# Altium footprint library TSC Footprints.PcbLib: 99 footprints (part 3 of 7)
Each footprint in its own frame and in the unit in brackets; x right, y up, seen from the top. Pads: shape width x height; smd on the part's side, far side on the other; paste and mask are expansions set on the pad; w line width, h text height; cw(c..) or ccw(c..) is an arc to the next point about the centre after c.
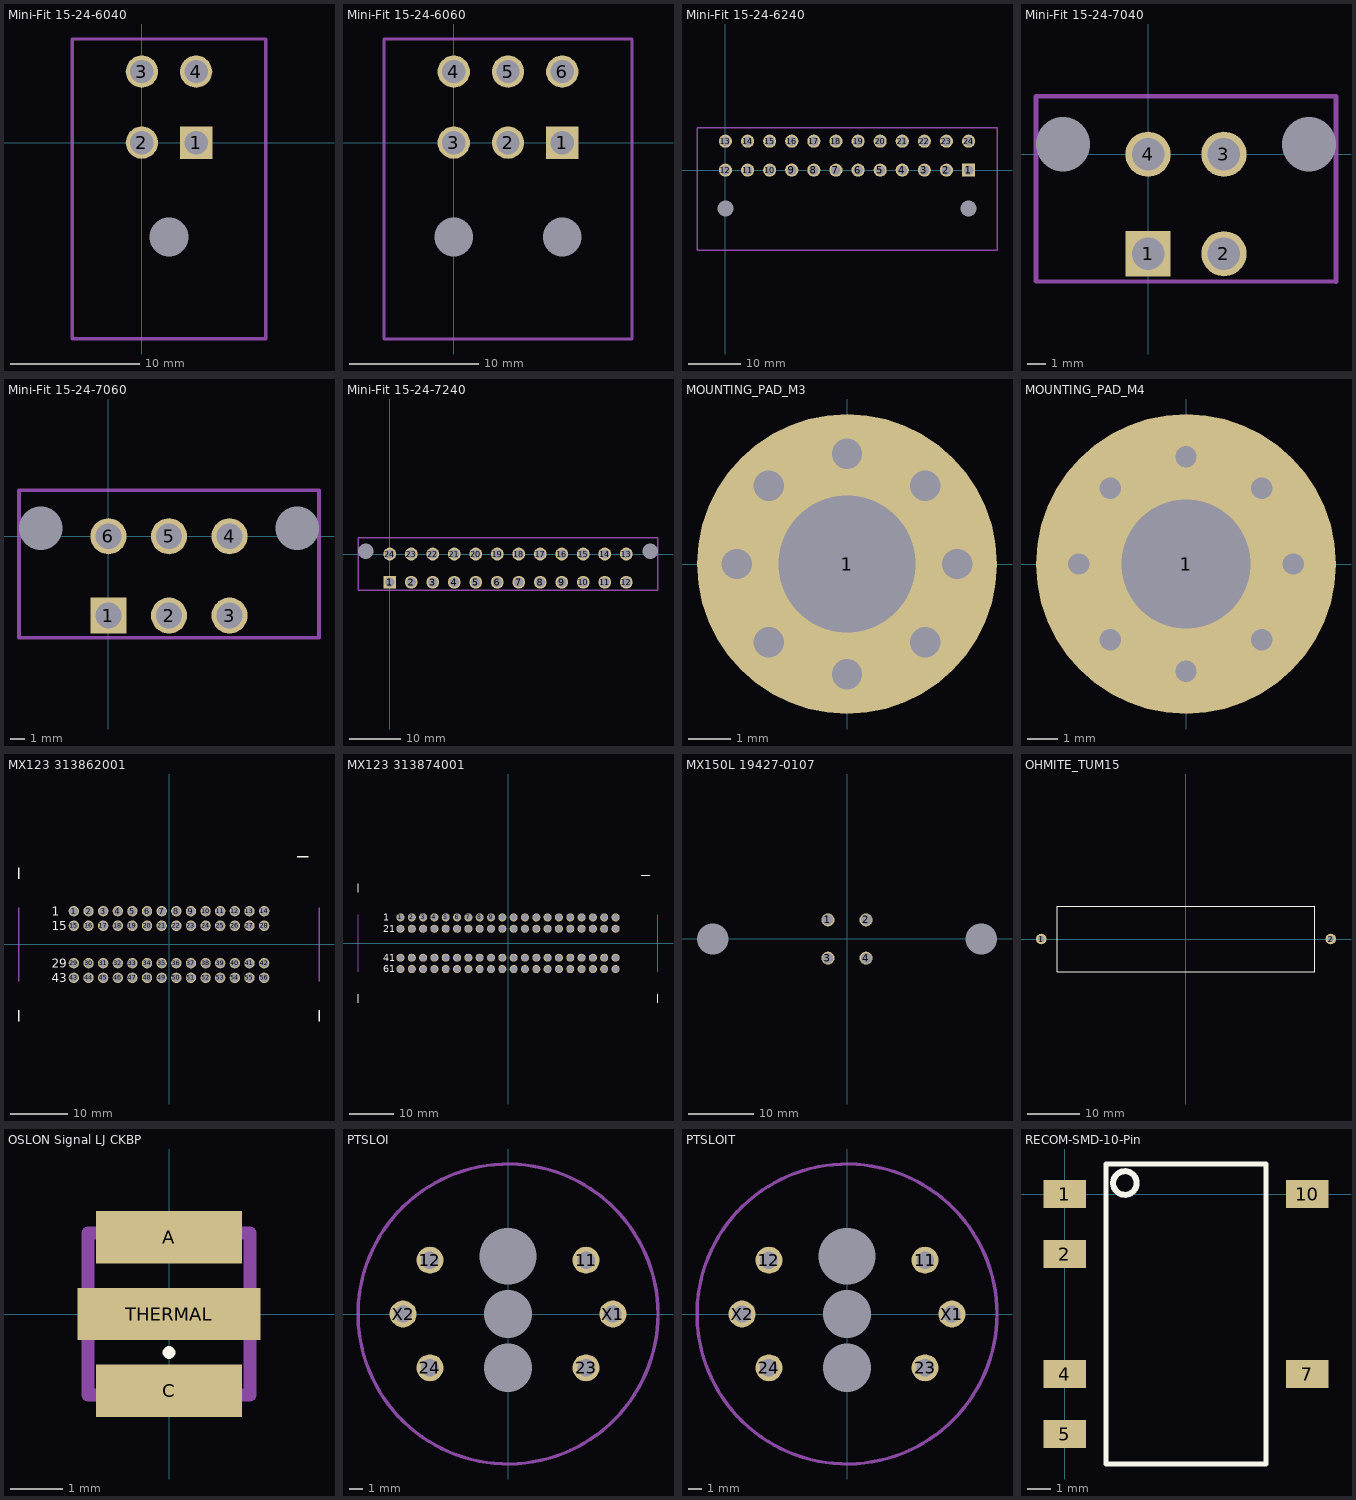
[diagram p2: the footprints below, top view; thin cyan lines are the x and y axes]

## Mini-Fit 15-24-6040 [mm] "Mini-Fit BMI Header 4 circuits"
height 15
pads (5):
  rect 2.5x2.5 hole 1.8: 1(4.2,0)
  round 2.5 hole 1.8: 2(0,0) 3(0,5.5) 4(4.2,5.5)
  round 0 hole 3 unplated: ""(2.1,-7.3)
Mechanical 1:
  lines w0.254: 9.586,-15.186 -5.4,-15.186 -5.4,8.025 9.6,8.025 9.6,-15.2
3D body "015246040.stp": height 15, standoff -3.3, extent -5.4,-15.2 9.6,6.025

## Mini-Fit 15-24-6060 [mm] "Mini-Fit BMI Header 6 circuits"
height 15
pads (8):
  rect 2.5x2.5 hole 1.8: 1(8.4,0)
  round 2.5 hole 1.8: 2(4.2,0) 3(0,0) 4(0,5.5) 5(4.2,5.5) 6(8.4,5.5)
  round 0 hole 3 unplated: ""(0,-7.3) ""(8.4,-7.3)
Mechanical 1:
  lines w0.254: -5.4,-15.2 -5.4,8.025 13.8,8.025 13.8,-15.2 -5.4,-15.2
3D body "015246060.stp": height 15, standoff -3.6, extent -5.4,-15.2 13.8,6.025

## Mini-Fit 15-24-6240 [mm] "Mini-Fit BMI Header 24 circuits"
height 15
pads (26):
  rect 2.5x2.5 hole 1.8: 1(46.2,0)
  round 2.5 hole 1.8: 2(42,0) 3(37.8,0) 4(33.6,0) 5(29.4,0) 6(25.2,0) 7(21,0) 8(16.8,0) 9(12.6,0) 10(8.4,0) 11(4.2,0) 12(0,0) 13(0,5.5) 14(4.2,5.5) 15(8.4,5.5) 16(12.6,5.5) 17(16.8,5.5) 18(21,5.5) 19(25.2,5.5) 20(29.4,5.5) 21(33.6,5.5) 22(37.8,5.5) 23(42,5.5) 24(46.2,5.5)
  round 0 hole 3 unplated: ""(0,-7.3) ""(46.2,-7.3)
Mechanical 1:
  lines w0.254: -5.4,-15.2 51.6,-15.2 51.6,8.025 -5.4,8.025 -5.4,-15.2
3D body "015246240.stp": height 15, standoff -3.6, extent -5.4,-15.2 51.6,6.025

## Mini-Fit 15-24-7040 [mm] "Mini-Fit BMI Receptacle Header 4 circuits"
height 11.3
pads (6):
  rect 2.5x2.5 hole 1.8: 1(0,-5.5)
  round 2.5 hole 1.8: 2(4.2,-5.5) 3(4.2,0) 4(0,0)
  round 0 hole 3 unplated: ""(-4.7,0.56) ""(8.9,0.56)
Mechanical 1:
  lines w0.254: -6.2,-7.03 -6.2,3.2 10.4,3.2 10.4,-7.044 -6.2,-7.03
3D body "015247040.stp": height 11.3, standoff -3.53, extent -5.566,-6.705 9.834,2.895

## Mini-Fit 15-24-7060 [mm] "Mini-Fit BMI Receptacle Header 6 circuits"
height 11.3
pads (8):
  rect 2.5x2.5 hole 1.8: 1(0,-5.5)
  round 2.5 hole 1.8: 2(4.2,-5.5) 3(8.4,-5.5) 4(8.4,0) 5(4.2,0) 6(0,0)
  round 0 hole 3 unplated: ""(-4.7,0.56) ""(13.1,0.56)
Mechanical 1:
  lines w0.254: 14.6,-7.048 -6.2,-7.03 -6.2,3.2 14.6,3.2 14.6,-7.044
3D body "015247060.stp": height 11.3, standoff -3.53, extent -5.566,-6.705 14.034,2.895

## Mini-Fit 15-24-7240 [mm] "Mini-Fit BMI Receptacle Header 24 circuits"
height 11.3
pads (26):
  rect 2.5x2.5 hole 1.8: 1(0,-5.5)
  round 2.5 hole 1.8: 2(4.2,-5.5) 3(8.4,-5.5) 4(12.6,-5.5) 5(16.8,-5.5) 6(21,-5.5) 7(25.2,-5.5) 8(29.4,-5.5) 9(33.6,-5.5) 10(37.8,-5.5) 11(42,-5.5) 12(46.2,-5.5) 13(46.2,0) 14(42,0) 15(37.8,0) 16(33.6,0) 17(29.4,0) 18(25.2,0) 19(21,0) 20(16.8,0) 21(12.6,0) 22(8.4,0) 23(4.2,0) 24(0,0)
  round 0 hole 3 unplated: ""(-4.7,0.56) ""(50.9,0.56)
Mechanical 1:
  lines w0.254: 52.4,-7.081 -6.2,-7.03 -6.2,3.2 52.4,3.2 52.4,-7.044
3D body "015247240.stp": height 11.3, standoff -3.53, extent -5.566,-6.705 51.834,2.895

## MOUNTING_PAD_M3 [mm] "M3 mounting pad"
pads (1):
  round 7 hole 3.2: 1(0,0)
via -1.821,1.821 diameter 1.27 hole 0.711
via 1.821,1.821 diameter 1.27 hole 0.711
via 1.821,-1.821 diameter 1.27 hole 0.711
via -1.821,-1.821 diameter 1.27 hole 0.711
via 2.575,0 diameter 1.27 hole 0.711
via -2.575,0 diameter 1.27 hole 0.711
via 0,-2.575 diameter 1.27 hole 0.711
via 0,2.575 diameter 1.27 hole 0.711

## MOUNTING_PAD_M4 [mm] "M4 mounting pad"
pads (1):
  round 10 hole 4.3: 1(0,0)
via -2.528,-2.528 diameter 1.27 hole 0.711
via 2.528,-2.528 diameter 1.27 hole 0.711
via 2.528,2.528 diameter 1.27 hole 0.711
via 0,3.575 diameter 1.27 hole 0.711
via 0,-3.575 diameter 1.27 hole 0.711
via -3.575,0 diameter 1.27 hole 0.711
via -2.528,2.528 diameter 1.27 hole 0.711
via 3.575,0 diameter 1.27 hole 0.711

## MX123 313862001 [mm] "56-Pin vertical sealed header"
height 31.55
pads (56):
  round 1.8 hole 1.47: 1(-16.51,5.79) 2(-13.97,5.79) 3(-11.43,5.79) 4(-8.89,5.79) 5(-6.35,5.79) 6(-3.81,5.79) 7(-1.27,5.79) 8(1.27,5.79) 9(3.81,5.79) 10(6.35,5.79) 11(8.89,5.79) 12(11.43,5.79) 13(13.97,5.79) 14(16.51,5.79) 15(-16.51,3.25) 16(-13.97,3.25) 17(-11.43,3.25) 18(-8.89,3.25) 19(-6.35,3.25) 20(-3.81,3.25) 21(-1.27,3.25) 22(1.27,3.25) 23(3.81,3.25) 24(6.35,3.25) 25(8.89,3.25) 26(11.43,3.25) 27(13.97,3.25) 28(16.51,3.25) 29(-16.51,-3.25) 30(-13.97,-3.25) 31(-11.43,-3.25) 32(-8.89,-3.25) 33(-6.35,-3.25) 34(-3.81,-3.25) 35(-1.27,-3.25) 36(1.27,-3.25) 37(3.81,-3.25) 38(6.35,-3.25) 39(8.89,-3.25) 40(11.43,-3.25) 41(13.97,-3.25) 42(16.51,-3.25) 43(-16.51,-5.79) 44(-13.97,-5.79) 45(-11.43,-5.79) 46(-8.89,-5.79) 47(-6.35,-5.79) 48(-3.81,-5.79) 49(-1.27,-5.79) 50(1.27,-5.79) 51(3.81,-5.79) 52(6.35,-5.79) 53(8.89,-5.79) 54(11.43,-5.79) 55(13.97,-5.79) 56(16.51,-5.79)
Top Overlay:
  lines w0.254: -26.035,-13.335 -26.035,-11.43 ; -26.035,11.43 -26.035,13.335 ; 22.225,15.24 24.13,15.24 ; 26.035,-13.335 26.035,-11.43
  text "43" at -20.32,-6.552 h1.52
  text "15" at -20.32,2.488 h1.52
  text "29" at -20.32,-4.012 h1.52
  text "1" at -20.32,5.028 h1.52
Mechanical 1:
  lines w0.254: -26.035,-6.35 -26.035,6.35 ; 26.035,-6.35 26.035,6.35
  text "DRESS 9" at 25.63,-5.08 h1.52
  text "DRESS 0" at -24.13,-5.078 h1.52
3D body "313862001.stp": height 31.71, standoff -3.09, extent -25.72,-16.33 25.72,16.35
3D body: height 0.25, standoff -5, extent -1.27,0 -1.27,0

## MX123 313874001 [mm] "80-Pin vertical sealed header"
height 31.55
pads (80):
  round 1.8 hole 1.47: 1(-24.13,5.79) 2(-21.59,5.79) 3(-19.05,5.79) 4(-16.51,5.79) 5(-13.97,5.79) 6(-11.43,5.79) 7(-8.89,5.79) 8(-6.35,5.79) 9(-3.81,5.79) 10(-1.27,5.79) 11(1.27,5.79) 12(3.81,5.79) 13(6.35,5.79) 14(8.89,5.79) 15(11.43,5.79) 16(13.97,5.79) 17(16.51,5.79) 18(19.05,5.79) 19(21.59,5.79) 20(24.13,5.79) 21(-24.13,3.25) 22(-21.59,3.25) 23(-19.05,3.25) 24(-16.51,3.25) 25(-13.97,3.25) 26(-11.43,3.25) 27(-8.89,3.25) 28(-6.35,3.25) 29(-3.81,3.25) 30(-1.27,3.25) 31(1.27,3.25) 32(3.81,3.25) 33(6.35,3.25) 34(8.89,3.25) 35(11.43,3.25) 36(13.97,3.25) 37(16.51,3.25) 38(19.05,3.25) 39(21.59,3.25) 40(24.13,3.25) 41(-24.13,-3.25) 42(-21.59,-3.25) 43(-19.05,-3.25) 44(-16.51,-3.25) 45(-13.97,-3.25) 46(-11.43,-3.25) 47(-8.89,-3.25) 48(-6.35,-3.25) 49(-3.81,-3.25) 50(-1.27,-3.25) 51(1.27,-3.25) 52(3.81,-3.25) 53(6.35,-3.25) 54(8.89,-3.25) 55(11.43,-3.25) 56(13.97,-3.25) 57(16.51,-3.25) 58(19.05,-3.25) 59(21.59,-3.25) 60(24.13,-3.25) 61(-24.13,-5.79) 62(-21.59,-5.79) 63(-19.05,-5.79) 64(-16.51,-5.79) 65(-13.97,-5.79) 66(-11.43,-5.79) 67(-8.89,-5.79) 68(-6.35,-5.79) 69(-3.81,-5.79) 70(-1.27,-5.79) 71(1.27,-5.79) 72(3.81,-5.79) 73(6.35,-5.79) 74(8.89,-5.79) 75(11.43,-5.79) 76(13.97,-5.79) 77(16.51,-5.79) 78(19.05,-5.79) 79(21.59,-5.79) 80(24.13,-5.79)
Top Overlay:
  lines w0.254: -33.655,-13.335 -33.655,-11.43 ; -33.655,11.43 -33.655,13.335 ; 29.845,15.24 31.75,15.24 ; 33.655,-13.335 33.655,-11.43
  text "61" at -27.94,-6.552 h1.52
  text "21" at -27.94,2.488 h1.52
  text "41" at -27.94,-4.012 h1.52
  text "1" at -27.94,5.028 h1.52
Mechanical 1:
  lines w0.254: -33.655,-6.35 -33.655,6.35 ; 33.655,-6.35 33.655,6.35
  text "DRESS 9" at 33.25,-5.08 h1.52
  text "DRESS 0" at -31.75,-5.078 h1.52
3D body "313874001.stp": height 31.71, standoff -3.09, extent -33.34,-16.335 33.34,16.345
3D body: height 0.25, standoff -5, extent -1.27,0 -1.27,0

## MX150L 19427-0107 [mm] "5.84mm Pitch MX150L Right Angle PCB Header, Dual Row, without PCB Flange, Gold (Au) Plated, 4 Circuits"
height 31.67
pads (6):
  round 2 hole 1.6: 1(-2.92,2.92) 2(2.92,2.92) 3(-2.92,-2.93) 4(2.92,-2.93)
  round 0 hole 4.8 unplated: ""(-20.61,0) ""(20.61,0)
3D body "194270107.stp": height 31.71, standoff -3.9, extent -24.155,-31.826 24.105,7.823

## OHMITE_TUM15 [mm] "Ceramic Housed Axial Terminal Power Resistor"
height 11.5
pads (2):
  round 2 hole 1.2: 1(-27.5,0) 2(27.5,0)
Top Overlay:
  lines w0.2: -24.5,-6.25 24.5,-6.25 24.5,6.25 -24.5,6.25 -24.5,-6.25
3D body: height 11.5, standoff 0, extent -24.5,-6.25 24.5,6.25

## OSLON Signal LJ CKBP [mm]
height 1.82
pads (4):
  rect 2.8x1 smd: A(0,1.47) C(0,-1.47)
  rect 3.5x1 smd: THERMAL(0,0)
  round 0.25 on Top Overlay: ""(0,-0.737)
Mechanical 1:
  lines w0.254: -1.55,-1.55 -1.55,1.55 1.55,1.55 1.55,-1.55 -1.55,-1.55
3D body "LJ_CKBP_201113_geometry.STEP": height 1.69, standoff 0, extent -1.5,-1.5 1.5,1.5

## PTSLOI [mm]
pads (9):
  round 2 hole 1.3: 11(5.8,4) 12(-5.8,4) 23(5.8,-4) 24(-5.8,-4) X1(7.8,0) X2(-7.8,0)
  round 0 hole 3.6 unplated: ""(0,-4) ""(0,0)
  round 0 hole 4.2 unplated: ""(0,4.3)
Mechanical 1:
  circle w0.254: c0,0 r11.15
3D body "SCHLEGEL_PTSLOI.stp": height 13.91, standoff -2.89, extent -9.1,-9.017 9.1,9.183

## PTSLOIT [mm]
pads (9):
  round 2 hole 1.3: 11(5.8,4) 12(-5.8,4) 23(5.8,-4) 24(-5.8,-4) X1(7.8,0) X2(-7.8,0)
  round 0 hole 3.6 unplated: ""(0,-4) ""(0,0)
  round 0 hole 4.2 unplated: ""(0,4.3)
Mechanical 1:
  circle w0.254: c0,0 r11.15
3D body "SCHLEGEL_PTSLOIT.stp": height 13.7, standoff -3.1, extent -9.097,-9.1 9.097,9.1

## RECOM-SMD-10-Pin [mm]
pads (6):
  rect 1.8x1.2 smd: 1(0,0) 2(0,-2.54) 4(0,-7.62) 5(0,-10.16) 7(10.25,-7.62) 10(10.25,0)
Top Overlay:
  circle w0.254: c2.54,0.465 r0.5
  lines w0.2: 1.735,-11.43 8.515,-11.43 8.515,1.27 1.735,1.27 1.735,-11.43